# Altium schematic symbol library FPGA_Xilinx_Virtex7.SchLib: 34 symbols (part 6 of 26) (continued)
## XC7VH580T-HCG1931 (continued)
part J pins: A5 MGTHRXN3_118, A6 MGTHRXP3_118, B3 MGTHTXN3_118, B4 MGTHTXP3_118, C1 MGTHTXN1_118, C2 MGTHTXP1_118, C5 MGTHRXN2_118, C6 MGTHRXP2_118, D3 MGTHTXN2_118, D4 MGTHTXP2_118, E1 MGTHTXN0_118, E2 MGTHTXP0_118, E5 MGTHRXN1_118, E6 MGTHRXP1_118, F3 MGTHRXN3_117, F4 MGTHRXP3_117, G1 MGTHTXN3_117, G2 MGTHTXP3_117, G5 MGTHRXN0_118, G6 MGTHRXP0_118, H3 MGTHRXN2_117, H4 MGTHRXP2_117, J1 MGTHTXN2_117, J2 MGTHTXP2_117, J5 MGTREFCLK0N_118, J6 MGTREFCLK0P_118, K3 MGTHRXN1_117, K4 MGTHRXP1_117, L1 MGTHTXN1_117, L2 MGTHTXP1_117, L5 MGTREFCLK1N_118, L6 MGTREFCLK1P_118, M3 MGTHRXN0_117, M4 MGTHRXP0_117, N1 MGTHTXN0_117, N2 MGTHTXP0_117, N5 MGTREFCLK0N_117, N6 MGTREFCLK0P_117, R5 MGTREFCLK1N_117, R6 MGTREFCLK1P_117
part K pins: AJ39 MGTREFCLK0P_214, AJ40 MGTREFCLK0N_214, AK41 MGTHRXP3_214, AK42 MGTHRXN3_214, AL39 MGTREFCLK1P_214, AL40 MGTREFCLK1N_214, AL43 MGTHTXP3_214, AL44 MGTHTXN3_214, AM41 MGTHRXP2_214, AM42 MGTHRXN2_214, AN39 MGTREFCLK0P_213, AN40 MGTREFCLK0N_213, AN43 MGTHTXP2_214, AN44 MGTHTXN2_214, AP41 MGTHRXP1_214, AP42 MGTHRXN1_214, AR39 MGTREFCLK1P_213, AR40 MGTREFCLK1N_213, AR43 MGTHTXP1_214, AR44 MGTHTXN1_214, AT41 MGTHRXP0_214, AT42 MGTHRXN0_214, AU39 MGTHRXP3_213, AU40 MGTHRXN3_213, AU43 MGTHTXP0_214, AU44 MGTHTXN0_214, AV41 MGTHRXP2_213, AV42 MGTHRXN2_213, AW39 MGTHRXP1_213, AW40 MGTHRXN1_213, AW43 MGTHTXP3_213, AW44 MGTHTXN3_213, AY41 MGTHRXP0_213, AY42 MGTHRXN0_213, BA43 MGTHTXP2_213, BA44 MGTHTXN2_213, BB41 MGTHTXP1_213, BB42 MGTHTXN1_213, BD41 MGTHTXP0_213, BD42 MGTHTXN0_213
part L pins: AA39 MGTREFCLK1P_216, AA40 MGTREFCLK1N_216, AA43 MGTHTXP0_216, AA44 MGTHTXN0_216, AB41 MGTHRXP3_215, AB42 MGTHRXN3_215, AC39 MGTREFCLK0P_215, AC40 MGTREFCLK0N_215, AC43 MGTHTXP3_215, AC44 MGTHTXN3_215, AD41 MGTHRXP2_215, AD42 MGTHRXN2_215, AE39 MGTREFCLK1P_215, AE40 MGTREFCLK1N_215, AE43 MGTHTXP2_215, AE44 MGTHTXN2_215, AF41 MGTHRXP1_215, AF42 MGTHRXN1_215, AG43 MGTHTXP1_215, AG44 MGTHTXN1_215, AH41 MGTHRXP0_215, AH42 MGTHRXN0_215, AJ43 MGTHTXP0_215, AJ44 MGTHTXN0_215, P41 MGTHRXP3_216, P42 MGTHRXN3_216, R43 MGTHTXP3_216, R44 MGTHTXN3_216, T41 MGTHRXP2_216, T42 MGTHRXN2_216, U39 MGTREFCLK0P_216, U40 MGTREFCLK0N_216, U43 MGTHTXP2_216, U44 MGTHTXN2_216, V41 MGTHRXP1_216, V42 MGTHRXN1_216, W43 MGTHTXP1_216, W44 MGTHTXN1_216, Y41 MGTHRXP0_216, Y42 MGTHRXN0_216
part M pins: A39 MGTHRXP3_218, A40 MGTHRXN3_218, B41 MGTHTXP3_218, B42 MGTHTXN3_218, C39 MGTHRXP2_218, C40 MGTHRXN2_218, C43 MGTHTXP1_218, C44 MGTHTXN1_218, D41 MGTHTXP2_218, D42 MGTHTXN2_218, E39 MGTHRXP1_218, E40 MGTHRXN1_218, E43 MGTHTXP0_218, E44 MGTHTXN0_218, F41 MGTHRXP3_217, F42 MGTHRXN3_217, G39 MGTHRXP0_218, G40 MGTHRXN0_218, G43 MGTHTXP3_217, G44 MGTHTXN3_217, H41 MGTHRXP2_217, H42 MGTHRXN2_217, J39 MGTREFCLK0P_218, J40 MGTREFCLK0N_218, J43 MGTHTXP2_217, J44 MGTHTXN2_217, K41 MGTHRXP1_217, K42 MGTHRXN1_217, L39 MGTREFCLK1P_218, L40 MGTREFCLK1N_218, L43 MGTHTXP1_217, L44 MGTHTXN1_217, M41 MGTHRXP0_217, M42 MGTHRXN0_217, N39 MGTREFCLK0P_217, N40 MGTREFCLK0N_217, N43 MGTHTXP0_217, N44 MGTHTXN0_217, R39 MGTREFCLK1P_217, R40 MGTREFCLK1N_217
part N pins: AA3 MGTAVTT_G12, AA42 MGTAVTT_G22, AB2 MGTAVTT_G12, AB6 MGTVCCAUX_G12, AB39 MGTVCCAUX_G22, AB43 MGTAVTT_G22, AC4 MGTAVCC_G11, AC41 MGTAVCC_G21, AD2 MGTAVTT_G11, AD6 MGTVCCAUX_G11, AD39 MGTVCCAUX_G21, AD43 MGTAVTT_G21, AF2 MGTAVTT_G11, AF5 MGTAVCC_G11, AF40 MGTAVCC_G21, AF43 MGTAVTT_G21, AG3 MGTAVTT_G11, AG5 MGTRREF_115, AG6 MGTAVTTRCAL_115, AG39 MGTAVTTRCAL_215, AG40 MGTRREF_215, AG42 MGTAVTT_G21, AJ4 MGTAVCC_G11, AJ41 MGTAVCC_G21, AK2 MGTAVTT_G11, AK43 MGTAVTT_G21, AM5 MGTAVCC_G11, AM40 MGTAVCC_G21, AP2 MGTAVTT_G11, AP43 MGTAVTT_G21, AR4 MGTAVCC_G11, AR41 MGTAVCC_G21, AV2 MGTAVTT_G11, AV5 MGTAVCC_G11, AV40 MGTAVCC_G21, AV43 MGTAVTT_G21, B5 MGTAVCC_G12, B40 MGTAVCC_G22, BA4 MGTAVCC_G11, BA41 MGTAVCC_G21, BB2 MGTAVTT_G11, BB43 MGTAVTT_G21, BC3 MGTAVTT_G11, BC42 MGTAVTT_G21, C3 MGTAVTT_G12, C42 MGTAVTT_G22, D2 MGTAVTT_G12, D43 MGTAVTT_G22, E4 MGTAVCC_G12, E41 MGTAVCC_G22, F2 MGTAVTT_G12, F43 MGTAVTT_G22, H5 MGTAVCC_G12, H40 MGTAVCC_G22, K2 MGTAVTT_G12, K43 MGTAVTT_G22, L4 MGTAVCC_G12, L41 MGTAVCC_G22, P2 MGTAVTT_G12, P5 MGTAVCC_G12, P40 MGTAVCC_G22, P43 MGTAVTT_G22, U4 MGTAVCC_G12, U41 MGTAVCC_G22, V2 MGTAVTT_G12, V43 MGTAVTT_G22, W5 MGTRREF_118, W6 MGTAVTTRCAL_118, W39 MGTAVTTRCAL_218, W40 MGTRREF_218, Y5 MGTAVCC_G12, Y40 MGTAVCC_G22
part O pins: A9 MGTZRXN7_300, A10 MGTZRXP7_300, A12 MGTZRXN5_300, A13 MGTZRXP5_300, A16 MGTZTXN7_300, A17 MGTZTXP7_300, A19 MGTZTXN5_300, A20 MGTZTXP5_300, A24 MGTZRXN3_300, A25 MGTZRXP3_300, A27 MGTZRXN1_300, A28 MGTZRXP1_300, A31 MGTZTXN3_300, A32 MGTZTXP3_300, A34 MGTZTXN1_300, A35 MGTZTXP1_300, C10 MGTZRXN6_300, C11 MGTZRXP6_300, C13 MGTZRXN4_300, C14 MGTZRXP4_300, C17 MGTZTXN6_300, C18 MGTZTXP6_300, C20 MGTZTXN4_300, C21 MGTZTXP4_300, C25 MGTZRXN2_300, C26 MGTZRXP2_300, C28 MGTZRXN0_300, C29 MGTZRXP0_300, C32 MGTZTXN2_300, C33 MGTZTXP2_300, C35 MGTZTXN0_300, C36 MGTZTXP0_300, E20 MGTZREFCLK0N_300, E21 MGTZREFCLK0P_300, E24 MGTZREFCLK1P_300, E25 MGTZREFCLK1N_300, G20 MGTZ_THERM_IN_300, G21 MGTZ_THERM_OUT_300, H22 MGTZ_OBS_CLK_N_300, J22 MGTZ_OBS_CLK_P_300
part P pins: A8 MGTZAGND_300, A11 MGTZAGND_300, A14 MGTZAGND_300, A15 MGTZAGND_300, A18 MGTZAGND_300, A21 MGTZAGND_300, A22 MGTZAGND_300, A23 MGTZAGND_300, A26 MGTZAGND_300, A29 MGTZAGND_300, A30 MGTZAGND_300, A33 MGTZAGND_300, A36 MGTZAGND_300, A37 MGTZAGND_300, B8 MGTZAGND_300, B9 MGTZAVCC_300, B10 MGTZAGND_300, B11 MGTZAVCC_300, B12 MGTZAGND_300, B13 MGTZAVCC_300, B14 MGTZAGND_300, B15 MGTZAVCC_300, B16 MGTZAGND_300, B17 MGTZAVCC_300, B18 MGTZAGND_300, B19 MGTZAVCC_300, B20 MGTZAGND_300, B21 MGTZAVCC_300, B22 MGTZAGND_300, B23 MGTZAVCC_300, B24 MGTZAGND_300, B25 MGTZAVCC_300, B26 MGTZAGND_300, B27 MGTZAVCC_300, B28 MGTZAGND_300, B29 MGTZAVCC_300, B30 MGTZAGND_300, B31 MGTZAVCC_300, B32 MGTZAGND_300, B33 MGTZAVCC_300, B34 MGTZAGND_300, B35 MGTZAVCC_300, B36 MGTZAGND_300, B37 MGTZAVCC_300, C8 MGTZAGND_300, C9 MGTZAGND_300, C12 MGTZAGND_300, C15 MGTZAGND_300, C16 MGTZAGND_300, C19 MGTZAGND_300, C22 MGTZAGND_300, C23 MGTZAGND_300, C24 MGTZAGND_300, C27 MGTZAGND_300, C30 MGTZAGND_300, C31 MGTZAGND_300, C34 MGTZAGND_300, C37 MGTZAGND_300, D8 MGTZAGND_300, D9 MGTZAGND_300, D10 MGTZAGND_300, D11 MGTZAGND_300, D12 MGTZAGND_300, D13 MGTZAGND_300, D14 MGTZAGND_300, D15 MGTZAGND_300, D16 MGTZAGND_300, D17 MGTZAGND_300, D18 MGTZAGND_300, D19 MGTZAGND_300, D20 MGTZAGND_300, D21 MGTZAGND_300, D22 MGTZAGND_300, D23 MGTZAGND_300, D24 MGTZAGND_300, D25 MGTZAGND_300, D26 MGTZAGND_300, D27 MGTZAGND_300, D28 MGTZAGND_300, D29 MGTZAGND_300, D30 MGTZAGND_300, D31 MGTZAGND_300, D32 MGTZAGND_300, D33 MGTZAGND_300, D34 MGTZAGND_300, D35 MGTZAGND_300, D36 MGTZAGND_300, D37 MGTZAGND_300, E18 MGTZ_SENSE_AVCC_300, F18 MGTZ_SENSE_AGND_300, F20 MGTZVCCH_300, F22 MGTZVCCH_300, F24 MGTZVCCH_300, F26 MGTZVCCH_300, G18 MGTZVCCH_300, G26 MGTZ_SENSE_GND_300, G27 MGTZ_SENSE_VCCH_300, H26 MGTZ_SENSE_VCC_300, J19 MGTZVCCH_300, J21 MGTZVCCH_300, J23 MGTZVCCH_300, J25 MGTZVCCH_300, J27 MGTZVCCH_300, K19 MGTZ_SENSE_VCCL_300, K20 MGTZ_SENSE_GNDL_300, L20 MGTZVCCL_300, L22 MGTZVCCL_300, L24 MGTZVCCL_300, L26 MGTZVCCL_300
part Q pins: AB22 VREFN_0, AB23 VP_0, AC22 VN_0, AC23 VREFP_0, AD22 DXN_0, AD23 DXP_0, L18 TCK_0, M17 INIT_B_0, M19 CCLK_0, M21 TDI_0, M23 M2_0, M25 M0_0, N26 TDO_0, P23 PROGRAM_B_0, P27 TMS_0, T19 M1_0, T27 DONE_0, V17 VCCO_0, W16 VCCO_0
part R pins: A3 GND, A4 GND, A7 GND, A38 GND, A41 GND, A42 GND, AA15 VCCINT, AA17 VCCINT, AA19 VCCAUX_IO_G3, AA21 VCCINT, AA22 GNDADC, AA23 VCCADC, AA25 VCCAUX_IO_G1, AA27 VCCINT, AA29 VCCINT, AA31 VCCINT, AB16 VCCINT, AB18 VCCAUX, AB20 VCCINT, AB24 VCCBRAM, AB26 VCCAUX, AB28 VCCINT, AB30 VCCINT, AC15 VCCINT, AC17 VCCINT, AC19 VCCAUX_IO_G3, AC21 VCCINT, AC25 VCCAUX_IO_G1, AC27 VCCINT, AC29 VCCINT, AD14 VCCINT, AD16 VCCINT, AD18 VCCAUX, AD20 VCCINT, AD24 VCCBRAM, AD26 VCCAUX, AD28 VCCINT, AD30 VCCINT, AE15 VCCINT, AE17 VCCINT, AE19 VCCAUX_IO_G2, AE21 VCCINT, AE23 VCCINT, AE25 VCCAUX_IO_G1, AE27 VCCINT, AE29 VCCINT, AE31 VCCINT, AF14 VCCINT, AF16 VCCINT, AF18 VCCAUX, AF20 VCCINT, AF22 VCCINT, AF24 VCCBRAM, AF26 VCCAUX, AF28 VCCINT, AF30 VCCINT, AG15 VCCINT, AG17 VCCINT, AG19 VCCAUX_IO_G2, AG21 VCCINT, AG23 VCCINT, AG25 VCCAUX_IO_G0, AG27 VCCINT, AG29 VCCINT, AH18 VCCAUX, AH20 VCCINT, AH22 VCCINT, AH24 VCCBRAM, AH26 VCCAUX, AH28 VCCINT, AJ17 VCCINT, AJ19 VCCAUX_IO_G2, AJ21 VCCINT, AJ23 VCCINT, AJ25 VCCAUX_IO_G0, AJ27 VCCINT, AJ29 VCCINT, AK18 VCCAUX, AK20 VCCINT, AK22 VCCINT, AK24 VCCBRAM, AK26 VCCAUX, AL19 VCCAUX_IO_G2, AL21 VCCINT, AL23 VCCINT, AL25 VCCAUX_IO_G0, AM20 VCCINT, AM22 VCCINT, AM24 VCCBRAM, AM26 VCCAUX, B2 GND, B6 GND, B7 GND, B38 GND, B39 GND, B43 GND, C4 GND, C7 GND, C38 GND, C41 GND, D1 GND, D5 GND, D6 GND, D7 GND, D38 GND, D39 GND, D40 GND, D44 GND, E3 GND, E7 GND, E8 GND, E9 GND, E10 GND, E11 GND, E12 GND, E13 GND, E14 GND, E15 GND, E16 GND, E17 GND, E19 GND, E22 GND, E23 GND, E26 GND, E27 GND, E28 GND, E29 GND, E30 GND, E31 GND, E32 GND, E33 GND, E34 GND, E35 GND, E36 GND, E37 GND, E38 GND, E42 GND, F1 GND, F5 GND, F6 GND, F7 GND, F17 GND, F19 GND, F21 GND, F23 GND, F25 GND, F27 GND, F28 GND, F37 GND, F38 GND, F39 GND, F40 GND, F44 GND, G3 GND, G4 GND, G7 GND, G14 GND, G17 GND, G19 GND, G22 GND, G23 GND, G24 GND, G25 GND, G28 GND, G34 GND, G38 GND, G41 GND, G42 GND, H1 GND, H2 GND, H6 GND, H7 GND, H11 GND, H17 GND, H18 GND, H19 GND, H20 GND, H21 GND, H23 GND, H24 GND, H25 GND, H27 GND, H28 GND, H31 GND, M27 VCCBATT_0, N17 VCCINT, N19 VCCINT, N21 VCCINT, N23 VCCINT, N25 VCCINT, N27 VCCINT, P18 VCCINT, P20 VCCINT, P22 VCCINT, P24 VCCINT, P26 VCCINT, P28 VCCINT, R17 VCCINT, R19 VCCINT, R21 VCCINT, R23 VCCINT, R25 VCCINT, R27 VCCINT, T18 VCCINT, T20 VCCINT, T22 VCCINT, T24 VCCINT, T26 VCCINT, T28 VCCINT, U17 VCCINT, U19 VCCINT, U21 VCCINT, U23 VCCBRAM, U25 VCCINT, U27 VCCINT, V16 VCCINT, V18 VCCINT, V20 VCCINT, V22 VCCINT, V24 VCCBRAM, V26 VCCINT, V28 VCCINT, V30 VCCINT, W15 VCCINT, W17 VCCINT, W19 VCCAUX_IO_G3, W21 VCCINT, W23 VCCBRAM, W25 VCCINT, W27 VCCINT, W29 VCCINT, W31 VCCINT, Y14 VCCINT, Y16 VCCINT, Y18 VCCAUX, Y20 VCCINT, Y22 VCCINT, Y24 VCCBRAM, Y26 VCCINT, Y28 VCCINT, Y30 VCCINT
part S pins: AA4 GND, AA7 GND, AA12 GND, AA14 GND, AA16 GND, AA18 GND, AA20 GND, AA24 GND, AA26 GND, AA28 GND, AA30 GND, AA32 GND, AA38 GND, AA41 GND, AB1 GND, AB5 GND, AB7 GND, AB9 GND, AB15 GND, AB17 GND, AB19 GND, AB21 GND, AB25 GND, AB27 GND, AB29 GND, AB31 GND, AB38 GND, AB40 GND, AB44 GND, AC3 GND, AC7 GND, AC14 GND, AC16 GND, AC18 GND, AC20 GND, AC24 GND, AC26 GND, AC28 GND, AC30 GND, AC36 GND, AC38 GND, AC42 GND, AD1 GND, AD5 GND, AD7 GND, AD13 GND, AD15 GND, AD17 GND, AD19 GND, AD21 GND, AD25 GND, AD27 GND, AD29 GND, AD31 GND, AD33 GND, AD38 GND, AD40 GND, AD44 GND, AE3 GND, AE4 GND, AE7 GND, AE10 GND, AE14 GND, AE16 GND, AE18 GND, AE20 GND, AE22 GND, AE24 GND, AE26 GND, AE28 GND, AE30 GND, AE38 GND, AE41 GND, AE42 GND, AF1 GND, AF6 GND, AF7 GND, AF15 GND, AF17 GND, AF19 GND, AF21 GND, AF23 GND, AF25 GND, AF27 GND, AF29 GND, AF31 GND, AF37 GND, AF38 GND, AF39 GND, AF44 GND, AG4 GND, AG7 GND, AG14 GND, AG16 GND, AG18 GND, AG20 GND, AG22 GND, AG24 GND, AG26 GND, AG28 GND, AG30 GND, AG34 GND, AG38 GND, AG41 GND, AH1 GND, AH2 GND, AH5 GND, AH6 GND, AH7 GND, AH11 GND, AH17 GND, AH19 GND, AH21 GND, AH23 GND, AH25 GND, AH27 GND, AH29 GND, AH31 GND, H38 GND, H39 GND, H43 GND, H44 GND, J3 GND, J4 GND, J7 GND, J8 GND, J17 GND, J18 GND, J20 GND, J24 GND, J26 GND, J28 GND, J38 GND, J41 GND, J42 GND, K1 GND, K5 GND, K6 GND, K7 GND, K15 GND, K17 GND, K18 GND, K21 GND, K22 GND, K23 GND, K24 GND, K25 GND, K26 GND, K27 GND, K28 GND, K35 GND, K38 GND, K39 GND, K40 GND, K44 GND, L3 GND, L7 GND, L12 GND, L17 GND, L19 GND, L21 GND, L23 GND, L25 GND, L27 GND, L28 GND, L32 GND, L38 GND, L42 GND, M1 GND, M2 GND, M5 GND, M6 GND, M7 GND, M9 GND, M18 GND, M20 GND, M22 GND, M24 GND, M26 GND, M28 GND, M29 GND, M38 GND, M39 GND, M40 GND, M43 GND, M44 GND, N3 GND, N4 GND, N7 GND, N16 GND, N18 GND, N20 GND, N22 GND, N24 GND, N28 GND, N36 GND, N38 GND, N41 GND, N42 GND, P1 GND, P6 GND, P7 GND, P13 GND, P17 GND, P19 GND, P21 GND, P25 GND, P33 GND, P38 GND, P39 GND, P44 GND, R3 GND, R4 GND, R7 GND, R10 GND, R18 GND, R20 GND, R22 GND, R24 GND, R26 GND, R28 GND, R30 GND, R38 GND, R41 GND, R42 GND, T1 GND, T2 GND, T5 GND, T6 GND, T7 GND, T17 GND, T21 GND, T23 GND, T25 GND, T37 GND, T38 GND, T39 GND, T40 GND, T43 GND, T44 GND, U3 GND, U7 GND, U14 GND, U16 GND, U18 GND, U20 GND, U22 GND, U24 GND, U26 GND, U28 GND, U34 GND, U38 GND, U42 GND, V1 GND, V5 GND, V6 GND, V7 GND, V11 GND, V15 GND, V19 GND, V21 GND, V23 GND, V25 GND, V27 GND, V29 GND, V31 GND, V38 GND, V39 GND, V40 GND, V44 GND, W3 GND, W4 GND, W7 GND, W8 GND, W18 GND, W20 GND, W22 GND, W24 GND, W26 GND, W28 GND, W30 GND, W38 GND, W41 GND, W42 GND, Y1 GND, Y2 GND, Y6 GND, Y7 GND, Y15 GND, Y17 GND, Y19 GND, Y21 GND, Y23 GND, Y25 GND, Y27 GND, Y29 GND, Y31 GND, Y35 GND, Y38 GND, Y39 GND, Y43 GND, Y44 GND
part T pins: AH38 GND, AH39 GND, AH40 GND, AH43 GND, AH44 GND, AJ3 GND, AJ7 GND, AJ8 GND, AJ18 GND, AJ20 GND, AJ22 GND, AJ24 GND, AJ26 GND, AJ28 GND, AJ38 GND, AJ42 GND, AK1 GND, AK5 GND, AK6 GND, AK7 GND, AK15 GND, AK19 GND, AK21 GND, AK23 GND, AK25 GND, AK35 GND, AK38 GND, AK39 GND, AK40 GND, AK44 GND, AL3 GND, AL4 GND, AL7 GND, AL12 GND, AL20 GND, AL22 GND, AL24 GND, AL26 GND, AL32 GND, AL38 GND, AL41 GND, AL42 GND, AM1 GND, AM2 GND, AM6 GND, AM7 GND, AM9 GND, AM19 GND, AM21 GND, AM23 GND, AM25 GND, AM29 GND, AM38 GND, AM39 GND, AM43 GND, AM44 GND, AN3 GND, AN4 GND, AN7 GND, AN16 GND, AN26 GND, AN36 GND, AN38 GND, AN41 GND, AN42 GND, AP1 GND, AP5 GND, AP6 GND, AP7 GND, AP13 GND, AP23 GND, AP33 GND, AP38 GND, AP39 GND, AP40 GND, AP44 GND, AR3 GND, AR7 GND, AR10 GND, AR20 GND, AR30 GND, AR38 GND, AR42 GND, AT1 GND, AT2 GND, AT5 GND, AT6 GND, AT7 GND, AT17 GND, AT27 GND, AT37 GND, AT38 GND, AT39 GND, AT40 GND, AT43 GND, AT44 GND, AU3 GND, AU4 GND, AU7 GND, AU14 GND, AU24 GND, AU34 GND, AU38 GND, AU41 GND, AU42 GND, AV1 GND, AV6 GND, AV7 GND, AV11 GND, AV21 GND, AV31 GND, AV38 GND, AV39 GND, AV44 GND, AW3 GND, AW4 GND, AW7 GND, AW8 GND, AW18 GND, AW28 GND, AW38 GND, AW41 GND, AW42 GND, AY1 GND, AY2 GND, AY5 GND, AY6 GND, AY7 GND, AY15 GND, AY25 GND, AY35 GND, AY38 GND, AY39 GND, AY40 GND, AY43 GND, AY44 GND, BA3 GND, BA5 GND, BA12 GND, BA22 GND, BA32 GND, BA40 GND, BA42 GND, BB1 GND, BB5 GND, BB9 GND, BB19 GND, BB29 GND, BB39 GND, BB40 GND, BB44 GND, BC2 GND, BC4 GND, BC5 GND, BC6 GND, BC16 GND, BC26 GND, BC36 GND, BC40 GND, BC41 GND, BC43 GND, BD5 GND, BD13 GND, BD23 GND, BD33 GND, BD40 GND

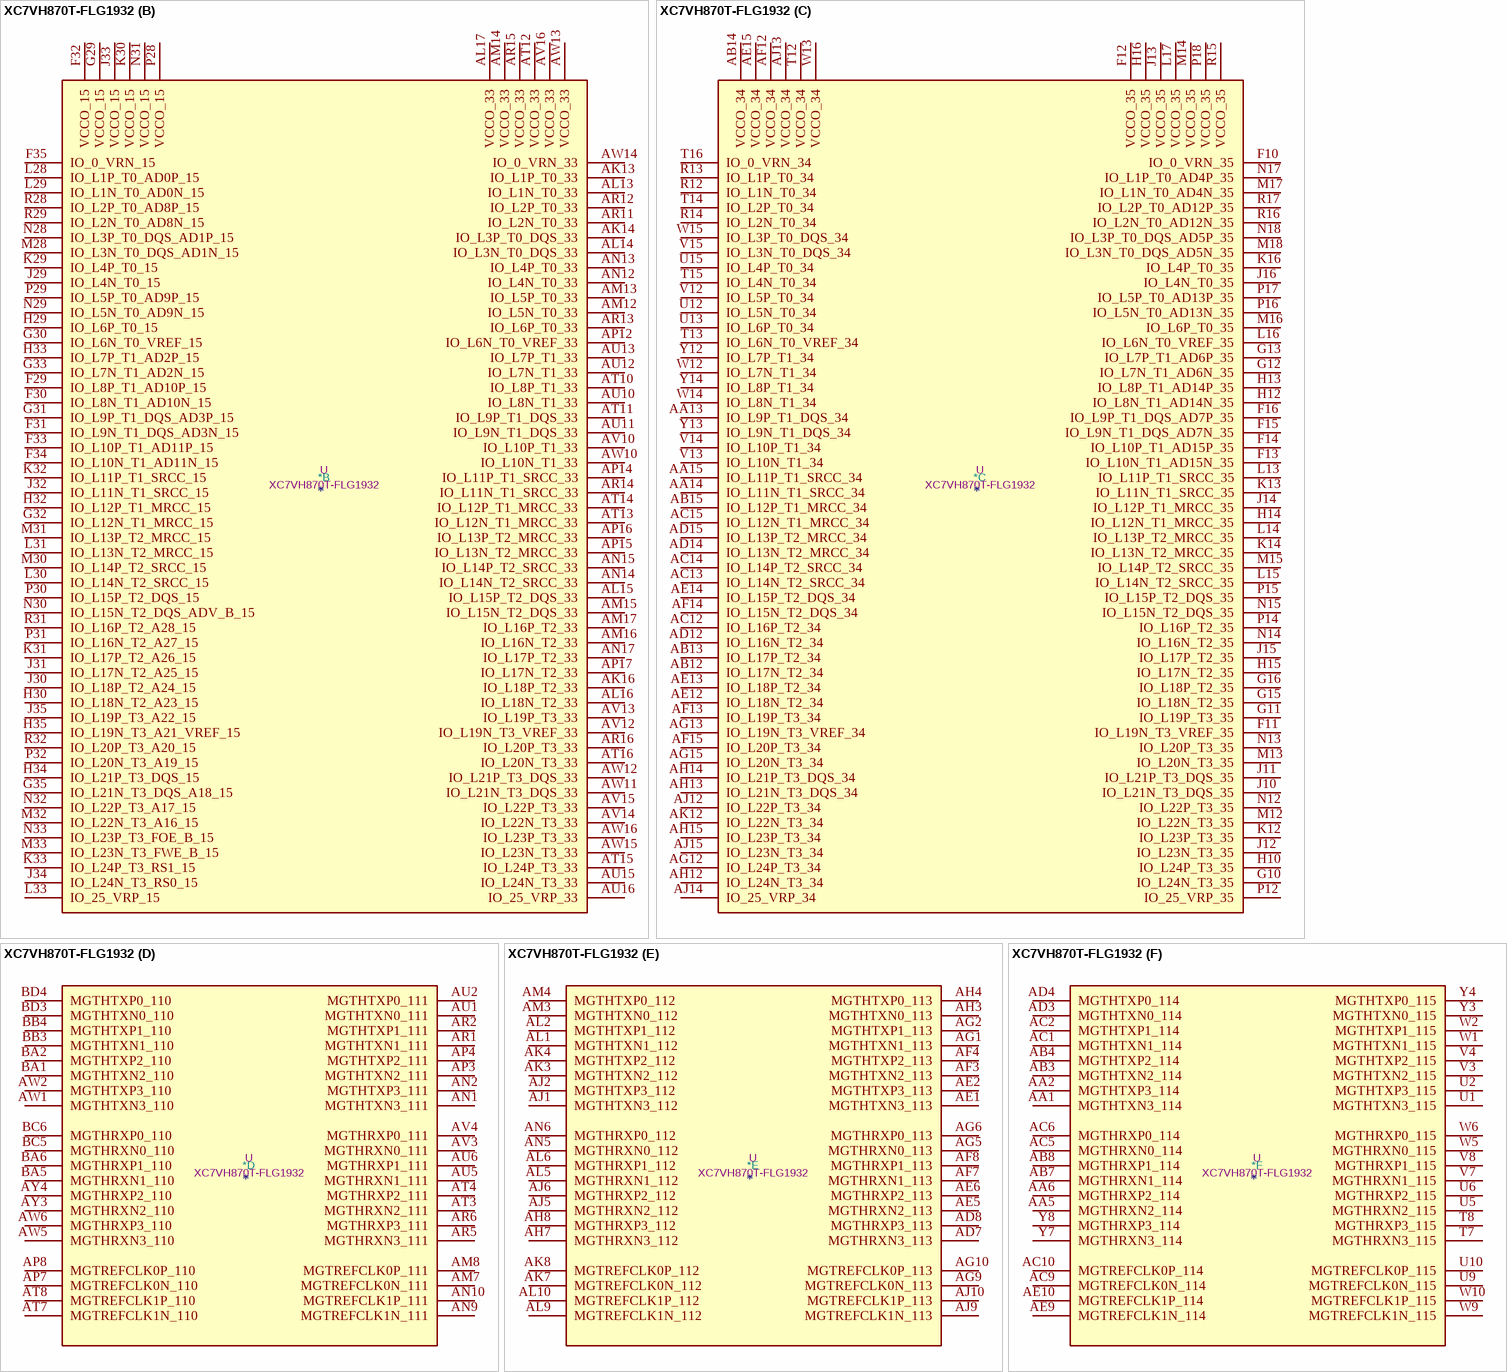
[diagram p43: symbol XC7VH870T-FLG1932]

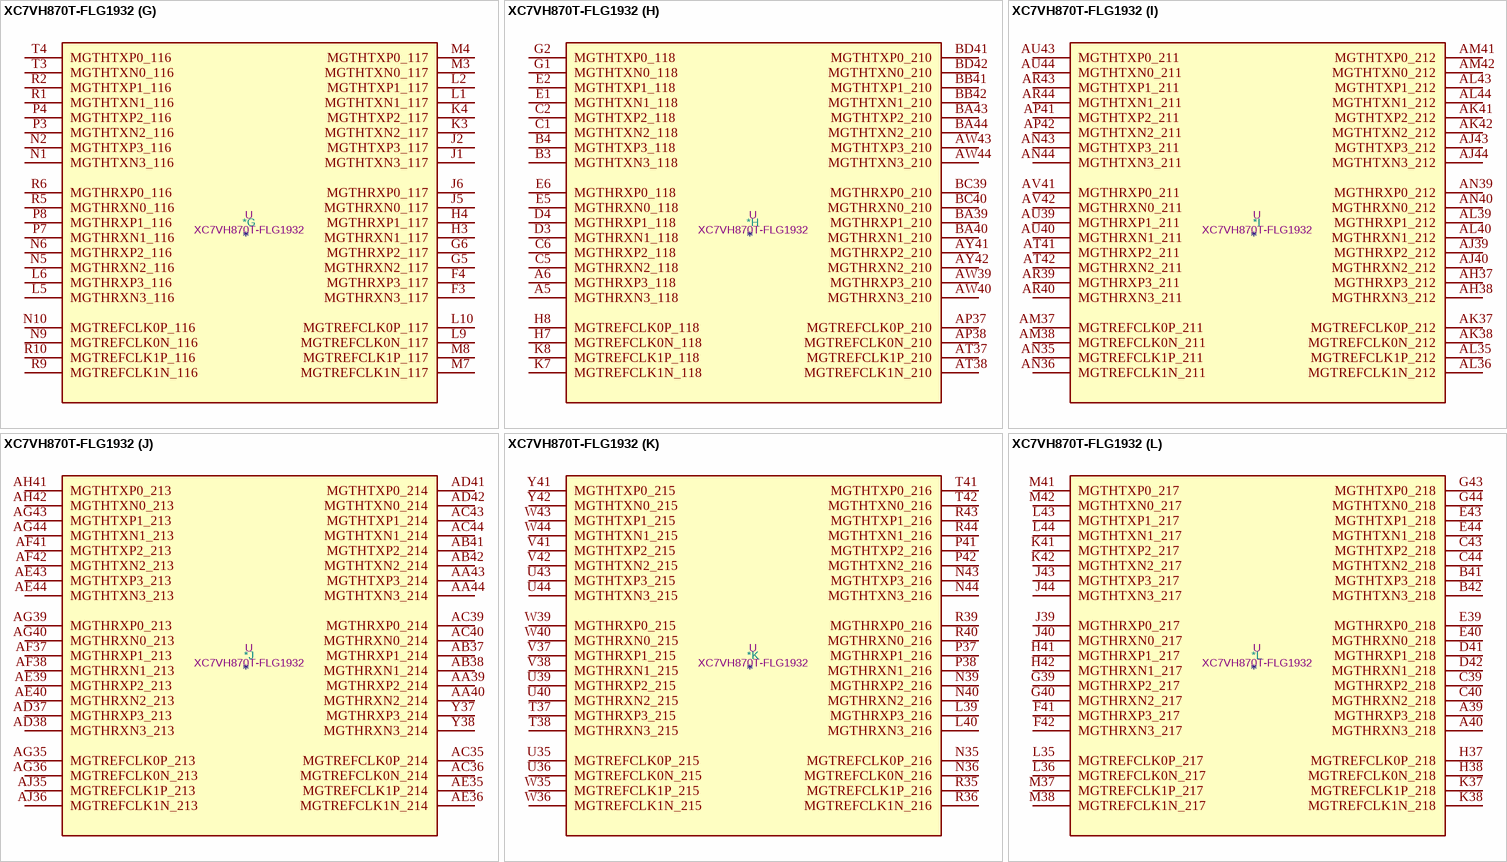
[diagram p44: symbol XC7VH870T-FLG1932]

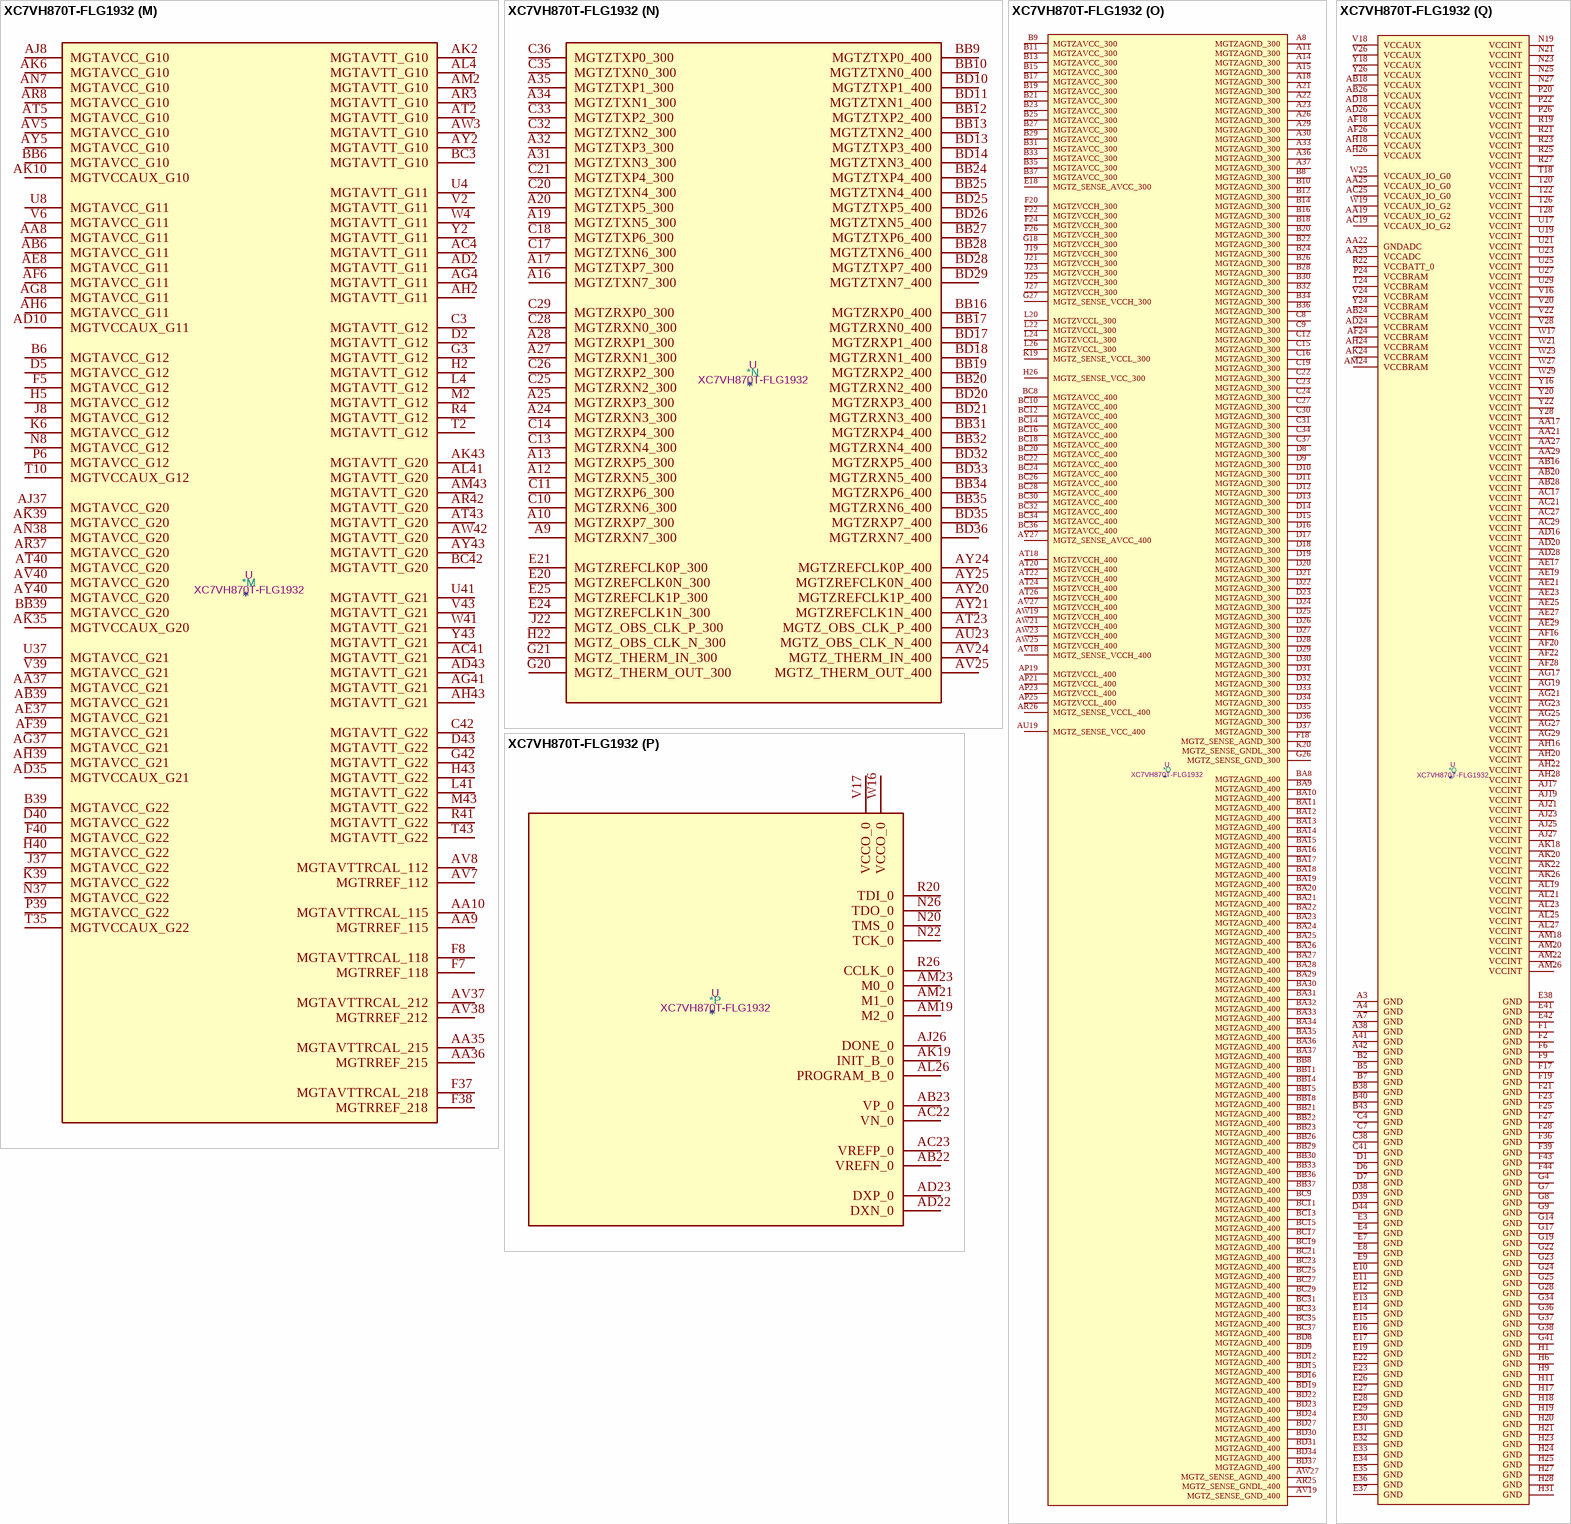
[diagram p45: symbol XC7VH870T-FLG1932]

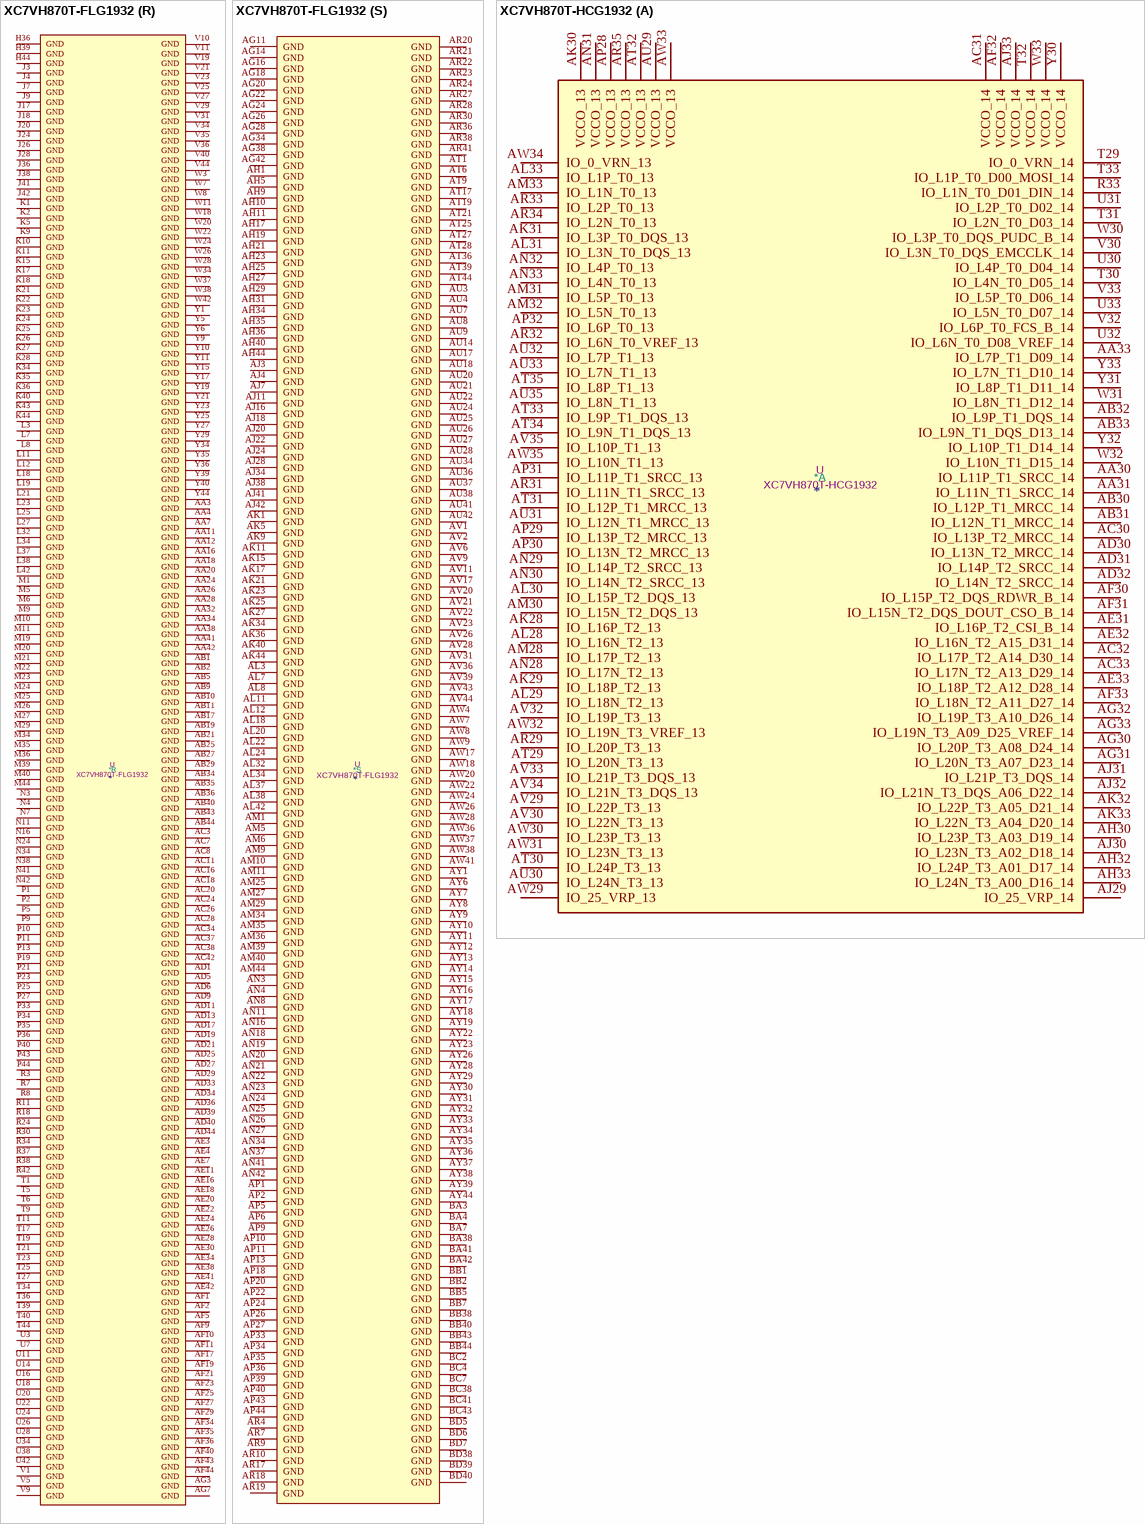
[diagram p46: symbols XC7VH870T-FLG1932 to XC7VH870T-HCG1932]